# Altium footprint library My Footprint.PcbLib: 268 footprints (part 11 of 17)
Each footprint in its own frame and in the unit in brackets; x right, y up, seen from the top. Pads: shape width x height; smd on the part's side, far side on the other; paste and mask are expansions set on the pad; w line width, h text height; cw(c..) or ccw(c..) is an arc to the next point about the centre after c.
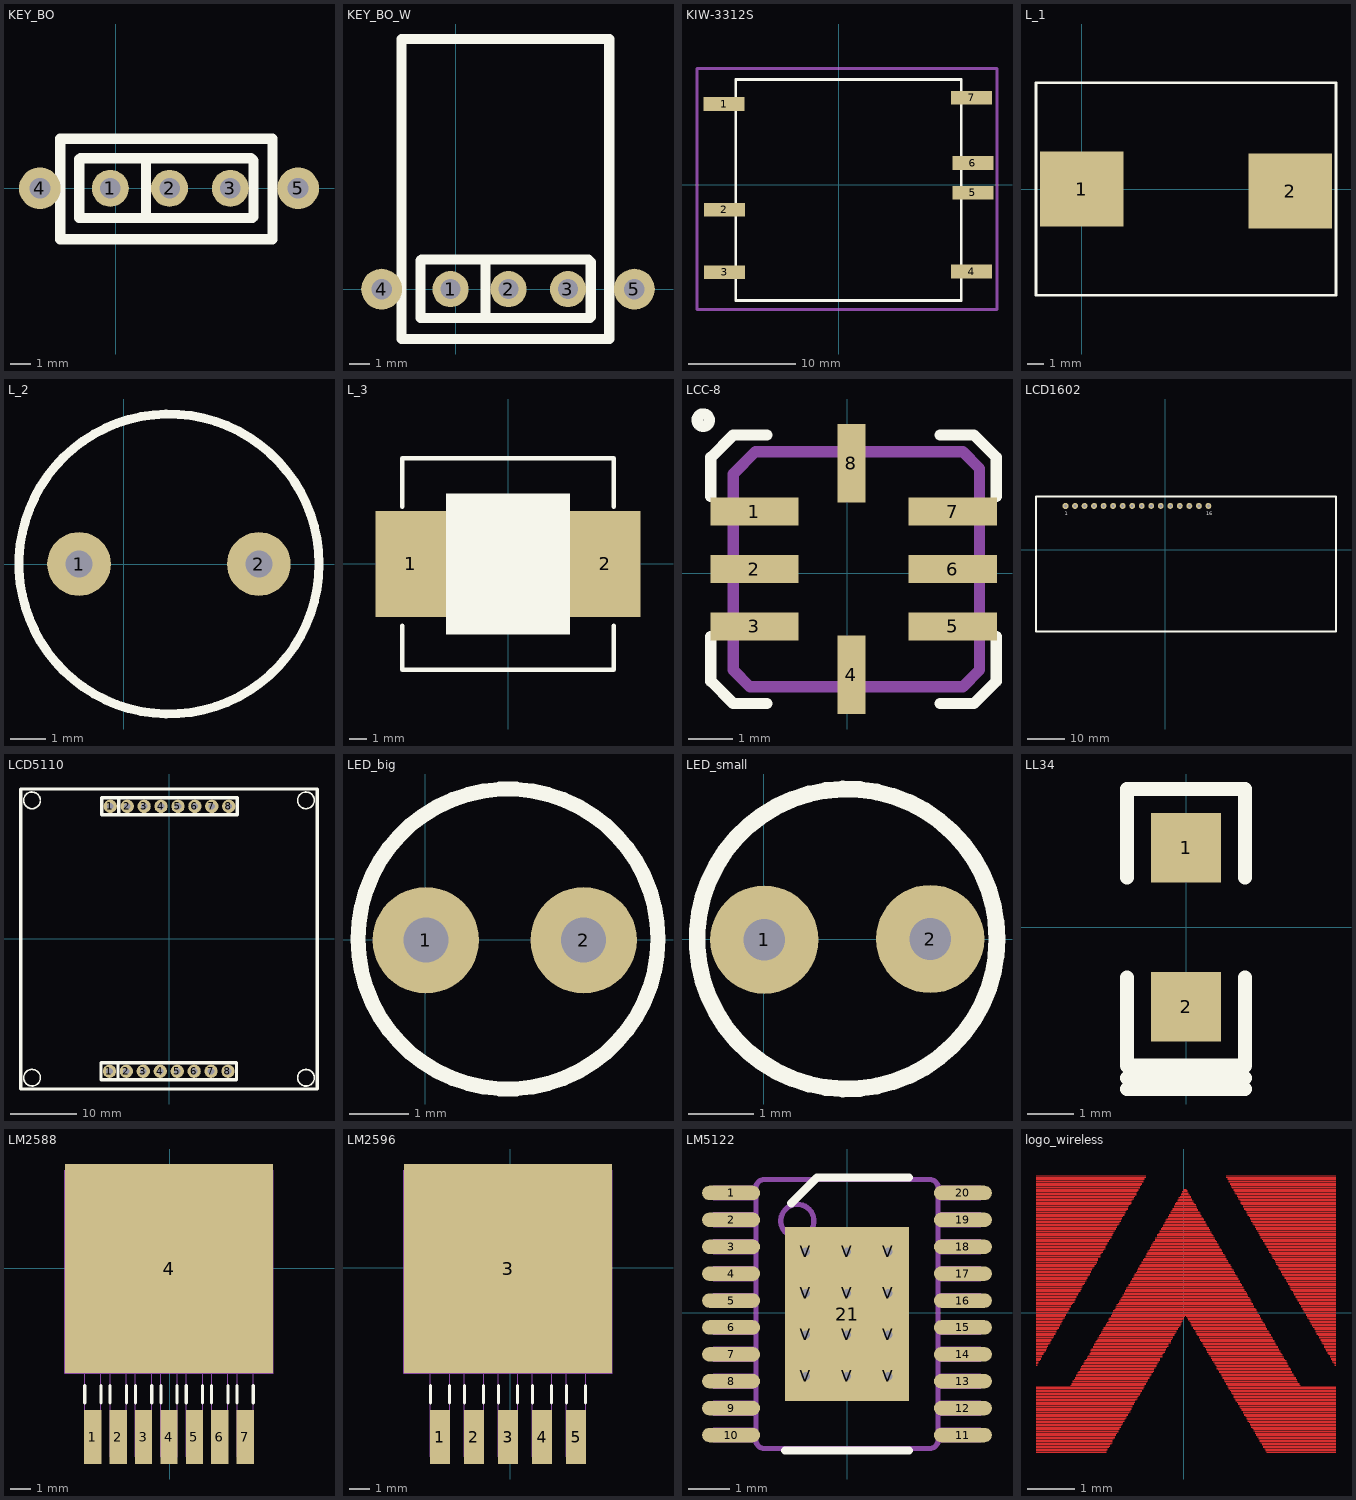
[diagram p10: the footprints below, top view; thin cyan lines are the x and y axes]

## KEY_BO [mm] "one of two"
pads (5):
  round 1.8 hole 1: 1(-0.254,0) 2(2.63,0) 3(5.588,0)
  round 2.032 hole 1.016: 4(-3.683,0) 5(8.89,0)
Top Overlay:
  lines w0.5: -1.76,-1.44 -1.76,1.42 -1.71,1.47 6.6,1.47 6.72,1.35 6.72,-1.39 6.67,-1.44 -1.73,-1.44 ; 1.48,-1.44 1.48,1.45 ; -2.69,-2.48 -2.69,2.413 7.64,2.413 7.64,-2.48 -2.69,-2.48

## KEY_BO_W [mm] "one of two"
pads (5):
  round 1.8 hole 1: 1(-0.254,0) 2(2.63,0) 3(5.588,0)
  round 2.032 hole 1.016: 4(-3.683,0) 5(8.89,0)
Top Overlay:
  lines w0.5: -1.76,-1.44 -1.76,1.42 -1.71,1.47 6.6,1.47 6.72,1.35 6.72,-1.39 6.67,-1.44 -1.73,-1.44 ; 1.48,-1.44 1.48,1.45 ; -2.69,-2.48 -2.69,12.446 7.64,12.446 7.64,-2.48 -2.69,-2.48
3D body "SWITCH SS12F23.STEP": height 5.25, standoff -3.85, extent -3.833,-0.635 9.167,12.265

## KIW-3312S [mil]
pads (7):
  rect 150x50 smd: 1(-420,295) 2(-419,-92) 3(-418,-321) 4(486,-318) 5(491,-30) 6(491,79) 7(486,318)
Top Overlay:
  lines w10: -377,-424 448,-424 448,385 -377,385 -377,-424
Mechanical 15:
  lines w10: -519,-457 -519,425 -412,425 579,425 579,-457 -519,-457

## L_1 [mil] "功率电感CD127  12*7"
height 82.68
pads (2):
  rect 200x180 smd: 1(0,0) 2(500,-5)
Top Overlay:
  lines w7: -110,-255 610,-255 610,255 -110,255 -110,-255
3D body "CD127.STEP": height 272.91, standoff 9.13, extent 3.93,-246.06 496.06,246.06

## L_2 [mm] "工字电感CT187"
pads (2):
  round 1.8 hole 0.762: 1(-1.27,0) 2(3.81,0)
Top Overlay:
  circle w0.254: c1.271,0 r4.237
3D body "CT187.STEP": height 11.2, standoff -5, extent -2.839,-4.191 5.461,4.109

## L_3 [mm] "12*12"
height 7
pads (2):
  rect 4x6 smd: 1(-5.5,0) 2(5.5,0)
Top Overlay:
  rectangle: -3.5,-4 3.5,4
  lines w0.254: -6,-3.5 -6,-6 6,-6 6,-3.5 ; -6,3.25 -6,6 6,6 6,3.25
3D body "User Library-MSS1260.STEP": height 6.1, standoff -0.05, extent -6.15,-6.15 6.15,6.15

## LCC-8 [mm]
pads (8):
  rect 2x0.635 smd: 1(-2.1,1.4) 2(-2.1,0.1) 3(-2.1,-1.2) 5(2.4,-1.2) 6(2.4,0.1) 7(2.4,1.4)
  rect 0.635x1.778 smd: 4(0.1,-2.3) 8(0.1,2.5)
Top Overlay:
  lines w0.254: -3.138,3.417 cw(c-3.263,3.478) -3.131,3.434 ; -3.09,-1.429 -3.09,-2.445 -2.582,-2.953 -1.82,-2.953 ; -3.09,1.746 -3.09,2.635 -2.582,3.143 -1.82,3.143 ; 2.117,-2.953 2.879,-2.953 3.387,-2.445 3.387,-1.429 ; 2.117,3.143 2.879,3.143 3.387,2.635 3.387,1.746
Mechanical 1:
  lines w0.254: -2.582,-2.191 -2.201,-2.572 2.625,-2.572 3.006,-2.191 3.006,2.381 2.625,2.762 -2.074,2.762 -2.582,2.254 -2.582,2.127 -2.582,-2.191
3D body: height 1.2, standoff 0, extent -2.821,-2.594 3.021,2.994

## LCD1602 [mil]
height 393.7
pads (16):
  oct 62x62 hole 32: 1(-1047.48,460.79)
  round 62 hole 32: 2(-947.48,460.79) 3(-847.48,460.79) 4(-747.48,460.79) 5(-647.48,460.79) 6(-547.48,460.79) 7(-447.48,460.79) 8(-347.48,460.79) 9(-247.48,460.79) 10(-147.48,460.79) 11(-47.48,460.79) 12(52.52,460.79) 13(152.52,460.79) 14(252.52,460.79) 15(352.52,460.79) 16(452.52,460.79)
Top Overlay:
  lines w19.68: -1357.48,-859.21 -1357.48,560.79 1792.52,560.79 1792.52,-859.21 -1357.48,-859.21
  text "16" at 432.52,360.79 h40
  text "1" at -1057.48,360.79 h40

## LCD5110 [mm]
pads (16):
  round 2 hole 1: 1(-8.948,-19.871) 1(-8.832,19.871) 2(-6.408,-19.871) 2(-6.292,19.871) 3(-3.868,-19.871) 3(-3.752,19.871) 4(-1.328,-19.871) 4(-1.212,19.871) 5(1.212,-19.871) 5(1.328,19.871) 6(3.752,-19.871) 6(3.868,19.871) 7(6.292,-19.871) 7(6.408,19.871) 8(8.832,-19.871) 8(8.948,19.871)
Top Overlay:
  lines w0.254: -20.568,-19.588 ccw(c-20.568,-20.838) -20.45,-19.594 ; -19.324,20.652 cw(c-20.568,20.771) -19.318,20.771 ; 19.283,-20.838 ccw(c20.533,-20.838) 19.288,-20.719 ; 20.414,19.527 cw(c20.533,20.771) 20.533,19.521
  lines w0.5: -22.268,22.369 -22.268,-22.529 22.232,-22.529 22.232,22.471 -22.268,22.471 ; -7.678,-21.141 -7.678,-18.601 ; -7.562,18.601 -7.562,21.141 ; -10.218,-21.141 10.102,-21.141 10.102,-18.601 -10.218,-18.601 -10.218,-21.141 ; -10.102,18.601 10.218,18.601 10.218,21.141 -10.102,21.141 -10.102,18.601

## LED_big [mm]
pads (2):
  round 1.8 hole 0.762: 1(0.01,-0.01) 2(2.68,-0.01)
Top Overlay:
  circle w0.254: c1.4,0.01 r2.539
3D body "LED5_BLUE.STEP": height 8.6, standoff -2, extent -1.453,-2.85 3.897,2.85

## LED_small [mil]
pads (2):
  round 65 hole 25: 1(0.39,-0.39) 2(100,0)
Top Overlay:
  circle w10: c50.05,0 r90.05
3D body "LED3_BLUE.STEP": height 204.72, standoff -78.74, extent -28.73,-78.66 109.85,78.68

## LL34 [mm]
pads (2):
  rect 1.5x1.5 smd: 1(0,1.714) 2(0,-1.714)
Top Overlay:
  lines w0.305: -1.27,-3.484 1.27,-3.484 ; -1.27,-3.244 1.27,-3.244 ; -1.27,-1.079 -1.27,-2.984 1.27,-2.984 1.27,-1.079 ; -1.27,1.079 -1.27,2.984 1.27,2.984 1.27,1.079
3D body "User Library-smd diode 1206.STEP": height 1.43, standoff -0.02, extent -0.725,-1.75 0.725,1.75

## LM2588 [mil]
pads (8):
  rect 34x106 smd: 1(-151,-333) 2(-101,-333) 3(-51,-333) 4(-1,-333) 5(49,-333) 6(99,-333) 7(149,-333)
  rect 410x412 smd: 4(-1,-1)
Top Overlay:
  lines w6: -167,-266 -167,-231 ; -135,-266 -135,-231 ; -117,-266 -117,-231 ; -85,-266 -85,-231 ; -67,-266 -67,-231 ; -35,-266 -35,-231 ; -17,-266 -17,-231 ; 15,-266 15,-231 ; 33,-266 33,-231 ; 65,-266 65,-231 ; 83,-266 83,-231 ; 115,-266 115,-231 ; 133,-266 133,-231 ; 165,-266 165,-231
Mechanical 1:
  lines w0: -206,-207 -206,193 204,193 204,-207 -206,-207 ; -167,-372 -135,-372 -135,-207 -167,-207 -167,-372 ; -117,-372 -85,-372 -85,-207 -117,-207 -117,-372 ; -67,-372 -35,-372 -35,-207 -67,-207 -67,-372 ; -17,-372 15,-372 15,-207 -17,-207 -17,-372 ; 33,-372 65,-372 65,-207 33,-207 33,-372 ; 83,-372 115,-372 115,-207 83,-207 83,-372 ; 133,-372 165,-372 165,-207 133,-207 133,-372
3D body "KTW0007B.stp": height 183, standoff -3, extent -200,-369.5 200,193.5

## LM2596 [mil]
pads (6):
  rect 40x106 smd: 1(-138,-334) 2(-71,-334) 3(-4,-334) 4(63,-334) 5(130,-334)
  rect 410x412 smd: 3(-4,-2)
Top Overlay:
  lines w6: -157,-267 -157,-232 ; -119,-267 -119,-232 ; -90,-267 -90,-232 ; -52,-267 -52,-232 ; -23,-267 -23,-232 ; 15,-267 15,-232 ; 44,-267 44,-232 ; 82,-267 82,-232 ; 111,-267 111,-232 ; 149,-267 149,-232
Mechanical 1:
  lines w0: -209,-208 201,-208 201,192 -209,192 -209,-208 ; -157,-373 -157,-208 -119,-208 -119,-373 -157,-373 ; -90,-373 -90,-208 -52,-208 -52,-373 -90,-373 ; -23,-373 -23,-208 15,-208 15,-373 -23,-373 ; 44,-373 44,-208 82,-208 82,-373 44,-373 ; 111,-373 111,-208 149,-208 149,-373 111,-373
3D body "KTW0007B.stp": height 180, standoff -6, extent -204,-371.5 196,191.5

## LM5122 [mm]
pads (33):
  oval 1.4x0.35 smd paste-0.102 mask+0.051: 1(-2.8,2.9) 2(-2.8,2.25) 3(-2.8,1.6) 4(-2.8,0.95) 5(-2.8,0.3) 6(-2.8,-0.35) 7(-2.8,-1) 8(-2.8,-1.65) 9(-2.8,-2.3) 10(-2.8,-2.95) 11(2.8,-2.95) 12(2.8,-2.3) 13(2.8,-1.65) 14(2.8,-1) 15(2.8,-0.35) 16(2.8,0.3) 17(2.8,0.95) 18(2.8,1.6) 19(2.8,2.25) 20(2.8,2.9)
  rect 3x4.2 smd paste-0.102 mask+0.051: 21(0,-0.025)
  round 0.5 / inner round 1.524 / far side round 0.5 hole 0.203 mask+0.051: V(-1,-1.525) V(-1,-0.525) V(-1,0.475) V(-1,1.475) V(0,-1.525) V(0,-0.525) V(0,0.475) V(0,1.475) V(1,-1.525) V(1,-0.525) V(1,0.475) V(1,1.475)
Top Overlay:
  lines w0.2: -1.5,-3.325 1.5,-3.325 ; -1.35,2.65 -0.725,3.275 1.5,3.275
Mechanical 1:
  drawing of 250 lines, arcs and shapes, not listed

## logo_wireless [mil]
Top Layer:
  lines w1: -124,-117 -65,-117 ; -124,-116 -65,-116 ; -124,-115 -64,-115 ; -124,-114 -64,-114 ; -124,-113 -63,-113 ; -124,-112 -62,-112 ; -124,-111 -62,-111 ; -124,-110 -61,-110 ; -124,-109 -60,-109 ; -124,-108 -60,-108 ; -124,-107 -60,-107 ; -124,-106 -59,-106 ; -124,-105 -58,-105 ; -124,-104 -58,-104 ; -124,-103 -57,-103 ; -124,-102 -57,-102 ; -124,-101 -56,-101 ; -124,-100 -55,-100 ; -124,-99 -55,-99 ; -124,-98 -54,-98 ; -124,-97 -54,-97 ; -124,-96 -53,-96 ; -124,-95 -53,-95 ; -124,-94 -52,-94 ; -124,-93 -51,-93 ; -124,-92 -51,-92 ; -124,-91 -50,-91 ; -124,-90 -50,-90 ; -124,-89 -49,-89 ; -124,-88 -48,-88 ; -124,-87 -48,-87 ; -124,-86 -47,-86 ; -124,-85 -47,-85 ; -124,-84 -46,-84 ; -124,-83 -45,-83 ; -124,-82 -45,-82 ; -124,-81 -44,-81 ; -124,-80 -44,-80 ; -124,-79 -43,-79 ; -124,-78 -43,-78 ; -124,-77 -42,-77 ; -124,-76 -42,-76 ; -124,-75 -41,-75 ; -124,-74 -41,-74 ; -124,-73 -40,-73 ; -124,-72 -39,-72 ; -124,-71 -39,-71 ; -124,-70 -38,-70 ; -124,-69 -37,-69 ; -124,-68 -37,-68 ; -124,-67 -36,-67 ; -124,-66 -35,-66 ; -124,-65 -35,-65 ; -124,-64 -34,-64 ; -124,-63 -34,-63 ; -124,-62 -33,-62 ; -124,-44 -123,-44 ; -124,-43 -123,-43 ; -124,-42 -122,-42 ; -124,-41 -122,-41 ; -124,-40 -121,-40 ; -124,-39 -120,-39 ; -124,-38 -120,-38 ; -124,-37 -119,-37 ; -124,-36 -119,-36 ; -124,-35 -118,-35 ; -124,-34 -118,-34 ; -124,-33 -117,-33 ; -124,-32 -116,-32 ; -124,-31 -116,-31 ; -124,-30 -115,-30 ; -124,-29 -115,-29 ; -124,-28 -114,-28 ; -124,-27 -114,-27 ; -124,-26 -113,-26 ; -124,-25 -112,-25 ; -124,-24 -112,-24 ; -124,-23 -111,-23 ; -124,-22 -111,-22 ; -124,-21 -110,-21 ; -124,-20 -109,-20 ; -124,-19 -109,-19 ; -124,-18 -108,-18 ; -124,-17 -108,-17 ; -124,-16 -107,-16 ; -124,-15 -107,-15 ; -124,-14 -106,-14 ; -124,-13 -105,-13 ; -124,-12 -105,-12 ; -124,-11 -104,-11 ; -124,-10 -104,-10 ; -124,-9 -103,-9 ; -124,-8 -103,-8 ; -124,-7 -102,-7 ; -124,-6 -102,-6 ; -124,-5 -101,-5 ; -124,-4 -100,-4 ; -124,-3 -100,-3 ; -124,-2 -99,-2 ; -124,-1 -99,-1 ; -124,0 -98,0 ; -124,1 -97,1 ; -124,2 -97,2 ; -124,3 -96,3 ; -124,4 -96,4 ; -124,5 -95,5 ; -124,6 -95,6 ; -124,7 -94,7 ; -124,8 -93,8 ; -124,9 -92,9 ; -124,10 -92,10 ; -124,11 -91,11 ; -124,12 -91,12 ; -124,13 -90,13 ; -124,14 -90,14 ; -124,15 -89,15 ; -124,16 -89,16 ; -124,17 -88,17 ; -124,18 -87,18 ; -124,19 -87,19 ; -124,20 -86,20 ; -124,21 -86,21 ; -124,22 -85,22 ; -124,23 -85,23 ; -124,24 -84,24 ; -124,25 -83,25 ; -124,26 -83,26 ; -124,27 -82,27 ; -124,28 -82,28 ; -124,29 -81,29 ; -124,30 -81,30 ; -124,31 -80,31 ; -124,32 -79,32 ; -124,33 -79,33 ; -124,34 -78,34 ; -124,35 -78,35 ; -124,36 -77,36 ; -124,37 -77,37 ; -124,38 -76,38 ; -124,39 -75,39 ; -124,40 -75,40 ; -124,41 -74,41 ; -124,42 -73,42 ; -124,43 -73,43 ; -124,44 -72,44 ; -124,45 -72,45 ; -124,46 -72,46 ; -124,47 -70,47 ; -124,48 -70,48 ; -124,49 -70,49 ; -124,50 -69,50 ; -124,51 -68,51 ; -124,52 -68,52 ; -124,53 -67,53 ; -124,54 -66,54 ; -124,55 -66,55 ; -124,56 -66,56 ; -124,57 -65,57 ; -124,58 -64,58 ; -124,59 -64,59 ; -124,60 -63,60 ; -124,61 -63,61 ; -124,62 -62,62 ; -124,63 -61,63 ; -124,64 -61,64 ; -124,65 -60,65 ; -124,66 -60,66 ; -124,67 -59,67 ; -124,68 -59,68 ; -124,69 -58,69 ; -124,70 -57,70 ; -124,71 -57,71 ; -124,72 -56,72 ; -124,73 -56,73 ; -124,74 -55,74 ; -124,75 -54,75 ; -124,76 -54,76 ; -124,77 -53,77 ; -124,78 -53,78 ; -124,79 -52,79 ; -124,80 -52,80 ; -124,81 -51,81 ; -124,82 -50,82 ; -124,83 -50,83 ; -124,84 -49,84 ; -124,85 -49,85 ; -124,86 -48,86 ; -124,87 -47,87 ; -124,88 -47,88 ; -124,89 -47,89 ; -124,90 -46,90 ; -124,91 -45,91 ; -124,92 -44,92 ; -124,93 -44,93 ; -124,94 -44,94 ; -124,95 -43,95 ; -124,96 -42,96 ; -124,97 -42,97 ; -124,98 -41,98 ; -124,99 -40,99 ; -124,100 -40,100 ; -124,101 -40,101 ; -124,102 -39,102 ; -124,103 -38,103 ; -124,104 -38,104 ; -124,105 -37,105 ; -124,106 -37,106 ; -124,107 -36,107 ; -124,108 -35,108 ; -124,109 -35,109 ; -124,110 -34,110 ; -124,111 -34,111 ; -124,112 -33,112 ; -124,113 -33,113 ; -124,114 -32,114 ; -124,115 -32,115 ; -95,-61 -33,-61 ; -94,-60 -32,-60 ; -94,-59 -32,-59 ; -93,-58 -31,-58 ; -93,-57 -30,-57 ; -92,-56 -30,-56 ; -91,-55 -29,-55 ; -91,-54 -29,-54 ; -90,-53 -28,-53 ; -90,-52 -27,-52 ; -89,-51 -27,-51 ; -89,-50 -26,-50 ; -88,-49 -25,-49 ; -87,-48 -25,-48 ; -87,-47 -25,-47 ; -86,-46 -24,-46 ; -86,-45 -23,-45 ; -85,-44 -23,-44 ; -84,-43 -22,-43 ; -84,-42 -22,-42 ; -83,-41 -21,-41 ; -83,-40 -20,-40 ; -82,-39 -20,-39 ; -81,-38 -20,-38 ; -81,-37 -18,-37 ; -80,-36 -18,-36 ; -79,-35 -18,-35 ; -79,-34 -17,-34 ; -78,-33 -16,-33 ; -78,-32 -16,-32 ; -78,-31 -15,-31 ; -77,-30 -15,-30 ; -76,-29 -14,-29 ; -76,-28 -13,-28 ; -75,-27 -13,-27 ; -75,-26 -13,-26 ; -74,-25 -11,-25 ; -74,-24 -11,-24 ; -73,-23 -11,-23 ; -72,-22 -10,-22 ; -72,-21 -9,-21 ; -71,-20 -9,-20 ; -71,-19 -8,-19 ; -70,-18 -8,-18 ; -69,-17 -7,-17 ; -69,-16 -6,-16 ; -68,-15 -6,-15 ; -68,-14 -5,-14 ; -67,-13 -5,-13 ; -67,-12 -4,-12 ; -66,-11 -3,-11 ; -65,-10 -3,-10 ; -65,-9 -2,-9 ; -64,-8 -2,-8 ; -63,-7 -1,-7 ; -63,-6 -1,-6 ; -63,-5 0,-5 ; -62,-4 0,-4 ; -61,-3 1,-3 ; -61,-2 64,-2 ; -60,-1 63,-1 ; -60,0 62,0 ; -59,1 62,1 ; -59,2 61,2 ; -58,3 61,3 ; -57,4 60,4 ; -57,5 59,5 ; -56,6 59,6 ; -56,7 58,7 ; -55,8 58,8 ; -54,9 57,9 ; -54,10 57,10 ; -53,11 56,11 ; -53,12 56,12 ; -52,13 55,13 ; -51,14 54,14 ; -51,15 54,15 ; -50,16 53,16 ; -50,17 53,17 ; -49,18 52,18 ; -49,19 51,19 ; -48,20 51,20 ; -48,21 50,21 ; -47,22 50,22 ; -46,23 49,23 ; -46,24 49,24 ; -45,25 48,25 ; -45,26 47,26 ; -44,27 47,27 ; -43,28 46,28 ; -43,29 46,29 ; -42,30 45,30 ; -42,31 45,31 ; -41,32 44,32 ; -41,33 43,33 ; -40,34 43,34 ; -39,35 42,35 ; -39,36 42,36 ; -38,37 41,37 ; -38,38 40,38 ; -37,39 40,39 ; -37,40 39,40 ; -36,41 39,41 ; -35,42 38,42 ; -35,43 37,43 ; -34,44 37,44 ; -34,45 36,45 ; -33,46 36,46 ; -32,47 35,47 ; -32,48 35,48 ; -31,49 34,49 ; -31,50 33,50 ; -30,51 33,51 ; -30,52 32,52 ; -29,53 32,53 ; -28,54 31,54 ; -28,55 30,55 ; -27,56 30,56 ; -27,57 29,57 ; -26,58 29,58 ; -26,59 28,59 ; -25,60 28,60 ; -24,61 27,61 ; -24,62 26,62 ; -24,63 26,63 ; -22,64 25,64 ; -22,65 25,65 ; -22,66 24,66 ; -21,67 23,67 ; -20,68 23,68 ; -20,69 22,69 ; -19,70 22,70 ; -19,71 21,71 ; -18,72 21,72 ; -17,73 20,73 ; -17,74 19,74 ; -16,75 19,75 ; -16,76 18,76 ; -15,77 18,77 ; -15,78 17,78 ; -14,79 17,79 ; -13,80 16,80 ; -13,81 15,81 ; -12,82 15,82 ; -12,83 14,83 ; -11,84 14,84 ; -11,85 13,85 ; -10,86 12,86 ; -9,87 12,87 ; -9,88 11,88 ; -8,89 11,89 ; -8,90 10,90 ; -7,91 10,91 ; -7,92 9,92 ; -6,93 8,93 ; -5,94 8,94 ; -5,95 7,95 ; -4,96 7,96 ; -4,97 6,97 ; -3,98 6,98 ; -2,99 5,99 ; -2,100 4,100 ; -1,101 4,101 ; -1,102 3,102 ; 0,103 3,103 ; 0,104 2,104 ; 2,-3 64,-3 ; 3,-4 65,-4 ; 4,-6 66,-6 ; 4,-5 65,-5 ; 5,-7 66,-7 ; 6,-9 68,-9 ; 6,-8 67,-8 ; 7,-11 69,-11 ; 7,-10 68,-10 ; 8,-13 70,-13 ; 8,-12 69,-12 ; 9,-14 70,-14 ; 10,-16 72,-16 ; 10,-15 71,-15 ; 11,-18 73,-18 ; 11,-17 72,-17 ; 12,-19 73,-19 ; 13,-21 75,-21 ; 13,-20 74,-20 ; 14,-23 76,-23 ; 14,-22 75,-22 ; 15,-24 76,-24 ; 16,-26 77,-26 ; 16,-25 77,-25 ; 17,-28 79,-28 ; 17,-27 78,-27 ; 18,-29 79,-29 ; 19,-31 80,-31 ; 19,-30 80,-30 ; 20,-33 81,-33 ; 20,-32 81,-32 ; 21,-35 83,-35 ; 21,-34 82,-34 ; 22,-36 83,-36 ; 23,-38 84,-38 ; 23,-37 84,-37 ; 24,-40 86,-40 ; 24,-39 85,-39 ; 25,-41 86,-41 ; 26,-43 87,-43 ; 26,-42 87,-42 ; 27,-44 88,-44 ; 28,-47 90,-47 ; 28,-46 89,-46 ; 28,-45 88,-45 ; 29,-48 90,-48 ; 30,-50 91,-50 ; 30,-49 91,-49 ; 31,-51 92,-51 ; 32,-53 93,-53 ; 32,-52 92,-52 ; 33,-55 94,-55 ; 33,-54 94,-54 ; 34,-57 95,-57 ; 34,-56 95,-56 ; 35,-58 96,-58 ; 36,-60 97,-60 ; 36,-59 97,-59 ; 36,114 128,114 ; 36,115 128,115 ; 37,-62 128,-62 ; 37,-61 98,-61 ; 37,112 128,112 ; 37,113 128,113 ; 38,-64 128,-64 ; 38,-63 128,-63 ; 38,110 128,110 ; 38,111 128,111 ; 39,-65 128,-65 ; 39,108 128,108 ; 39,109 128,109 ; 40,-67 128,-67 ; 40,-66 128,-66 ; 40,106 128,106 ; 40,107 128,107 ; 41,-68 128,-68 ; 41,105 128,105 ; 42,-71 128,-71 ; 42,-70 128,-70 ; 42,-69 128,-69 ; 42,103 128,103 ; 42,104 128,104 ; 43,-72 128,-72 ; 43,101 128,101 ; 43,102 128,102 ; 44,-74 128,-74 ; 44,-73 128,-73 ; 44,100 128,100 ; 45,-75 128,-75 ; 45,98 128,98 ; 45,99 128,99 ; 46,-77 128,-77 ; 46,-76 128,-76 ; 46,96 128,96 ; 46,97 128,97 ; 47,-79 128,-79 ; 47,-78 128,-78 ; 47,95 128,95 ; 48,-80 128,-80 ; 48,92 128,92 ; 48,93 128,93 ; 48,94 128,94 ; 49,-82 128,-82 ; 49,-81 128,-81 ; 49,91 128,91 ; 50,-84 128,-84 ; 50,-83 128,-83 ; 50,89 128,89 ; 50,90 128,90 ; 51,-86 128,-86 ; 51,-85 128,-85 ; 51,87 128,87 ; 51,88 128,88 ; 52,-87 128,-87 ; 52,86 128,86 ; 53,-89 128,-89 ; 53,-88 128,-88 ; 53,84 128,84 ; 53,85 128,85 ; 54,-91 128,-91 ; 54,-90 128,-90 ; 54,82 128,82 ; 54,83 128,83 ; 55,-92 128,-92 ; 55,81 128,81 ; 56,-94 128,-94 ; 56,-93 128,-93 ; 56,79 128,79 ; 56,80 128,80 ; 57,-96 128,-96 ; 57,-95 128,-95 ; 57,77 128,77 ; 57,78 128,78 ; 58,-97 128,-97 ; 58,75 128,75 ; 58,76 128,76 ; 59,-99 128,-99 ; 59,-98 128,-98 ; 59,74 128,74 ; 60,-101 128,-101 ; 60,-100 128,-100 ; 60,72 128,72 ; 60,73 128,73 ; 61,-103 128,-103 ; 61,-102 128,-102 ; 61,70 128,70 ; 61,71 128,71 ; 62,-104 128,-104 ; 62,69 128,69 ; 63,-106 128,-106 ; 63,-105 128,-105 ; 63,67 128,67 ; 63,68 128,68 ; 64,-108 128,-108 ; 64,-107 128,-107 ; 64,65 128,65 ; 64,66 128,66 ; 65,-109 128,-109 ; 65,63 128,63 ; 65,64 128,64 ; 66,-111 128,-111 ; 66,-110 128,-110 ; 66,62 128,62 ; 67,-113 128,-113 ; 67,-112 128,-112 ; 67,60 128,60 ; 67,61 128,61 ; 68,-114 128,-114 ; 68,58 128,58 ; 68,59 128,59 ; 69,-116 128,-116 ; 69,-115 128,-115 ; 69,57 128,57 ; 70,-117 128,-117 ; 70,55 128,55 ; 70,56 128,56 ; 71,53 128,53 ; 71,54 128,54 ; 72,51 128,51 ; 72,52 128,52 ; 73,50 128,50 ; 74,48 128,48 ; 74,49 128,49 ; 75,46 128,46 ; 75,47 128,47 ; 76,45 128,45 ; 77,43 128,43 ; 77,44 128,44 ; 78,41 128,41 ; 78,42 128,42 ; 79,40 128,40 ; 80,37 128,37 ; 80,38 128,38 ; 80,39 128,39 ; 81,36 128,36 ; 82,34 128,34 ; 82,35 128,35 ; 83,32 128,32 ; 83,33 128,33 ; 84,31 128,31 ; 85,29 128,29 ; 85,30 128,30 ; 86,27 128,27 ; 86,28 128,28 ; 87,26 128,26 ; 88,24 128,24 ; 88,25 128,25 ; 89,22 128,22 ; 89,23 128,23 ; 90,20 128,20 ; 90,21 128,21 ; 91,19 128,19 ; 92,17 128,17 ; 92,18 128,18 ; 93,15 128,15 ; 93,16 128,16 ; 94,13 128,13 ; 94,14 128,14 ; 95,12 128,12 ; 96,10 128,10 ; 96,11 128,11 ; 97,8 128,8 ; 97,9 128,9 ; 98,7 128,7 ; 99,5 128,5 ; 99,6 128,6 ; 100,3 128,3 ; 100,4 128,4 ; 101,1 128,1 ; 101,2 128,2 ; 102,0 128,0 ; 103,-2 128,-2 ; 103,-1 128,-1 ; 104,-4 128,-4 ; 104,-3 128,-3 ; 105,-5 128,-5 ; 106,-7 128,-7 ; 106,-6 128,-6 ; 107,-9 128,-9 ; 107,-8 128,-8 ; 108,-11 128,-11 ; 108,-10 128,-10 ; 109,-12 128,-12 ; 110,-14 128,-14 ; 110,-13 128,-13 ; 111,-16 128,-16 ; 111,-15 128,-15 ; 112,-18 128,-18 ; 112,-17 128,-17 ; 113,-19 128,-19 ; 114,-21 128,-21 ; 114,-20 128,-20 ; 115,-23 128,-23 ; 115,-22 128,-22 ; 116,-25 128,-25 ; 116,-24 128,-24 ; 117,-26 128,-26 ; 118,-29 128,-29 ; 118,-28 128,-28 ; 118,-27 128,-27 ; 119,-30 128,-30 ; 120,-32 128,-32 ; 120,-31 128,-31 ; 121,-34 128,-34 ; 121,-33 128,-33 ; 122,-35 128,-35 ; 123,-37 128,-37 ; 123,-36 128,-36 ; 124,-39 128,-39 ; 124,-38 128,-38 ; 125,-41 128,-41 ; 125,-40 128,-40 ; 126,-42 128,-42 ; 127,-44 128,-44 ; 127,-43 128,-43